# Altium footprint library LUMI_Standard_Auto_Soldering_LIB.PcbLib: 344 footprints (part 13 of 22)
Each footprint in its own frame and in the unit in brackets; x right, y up, seen from the top. Pads: shape width x height; smd on the part's side, far side on the other; paste and mask are expansions set on the pad; w line width, h text height; cw(c..) or ccw(c..) is an arc to the next point about the centre after c.
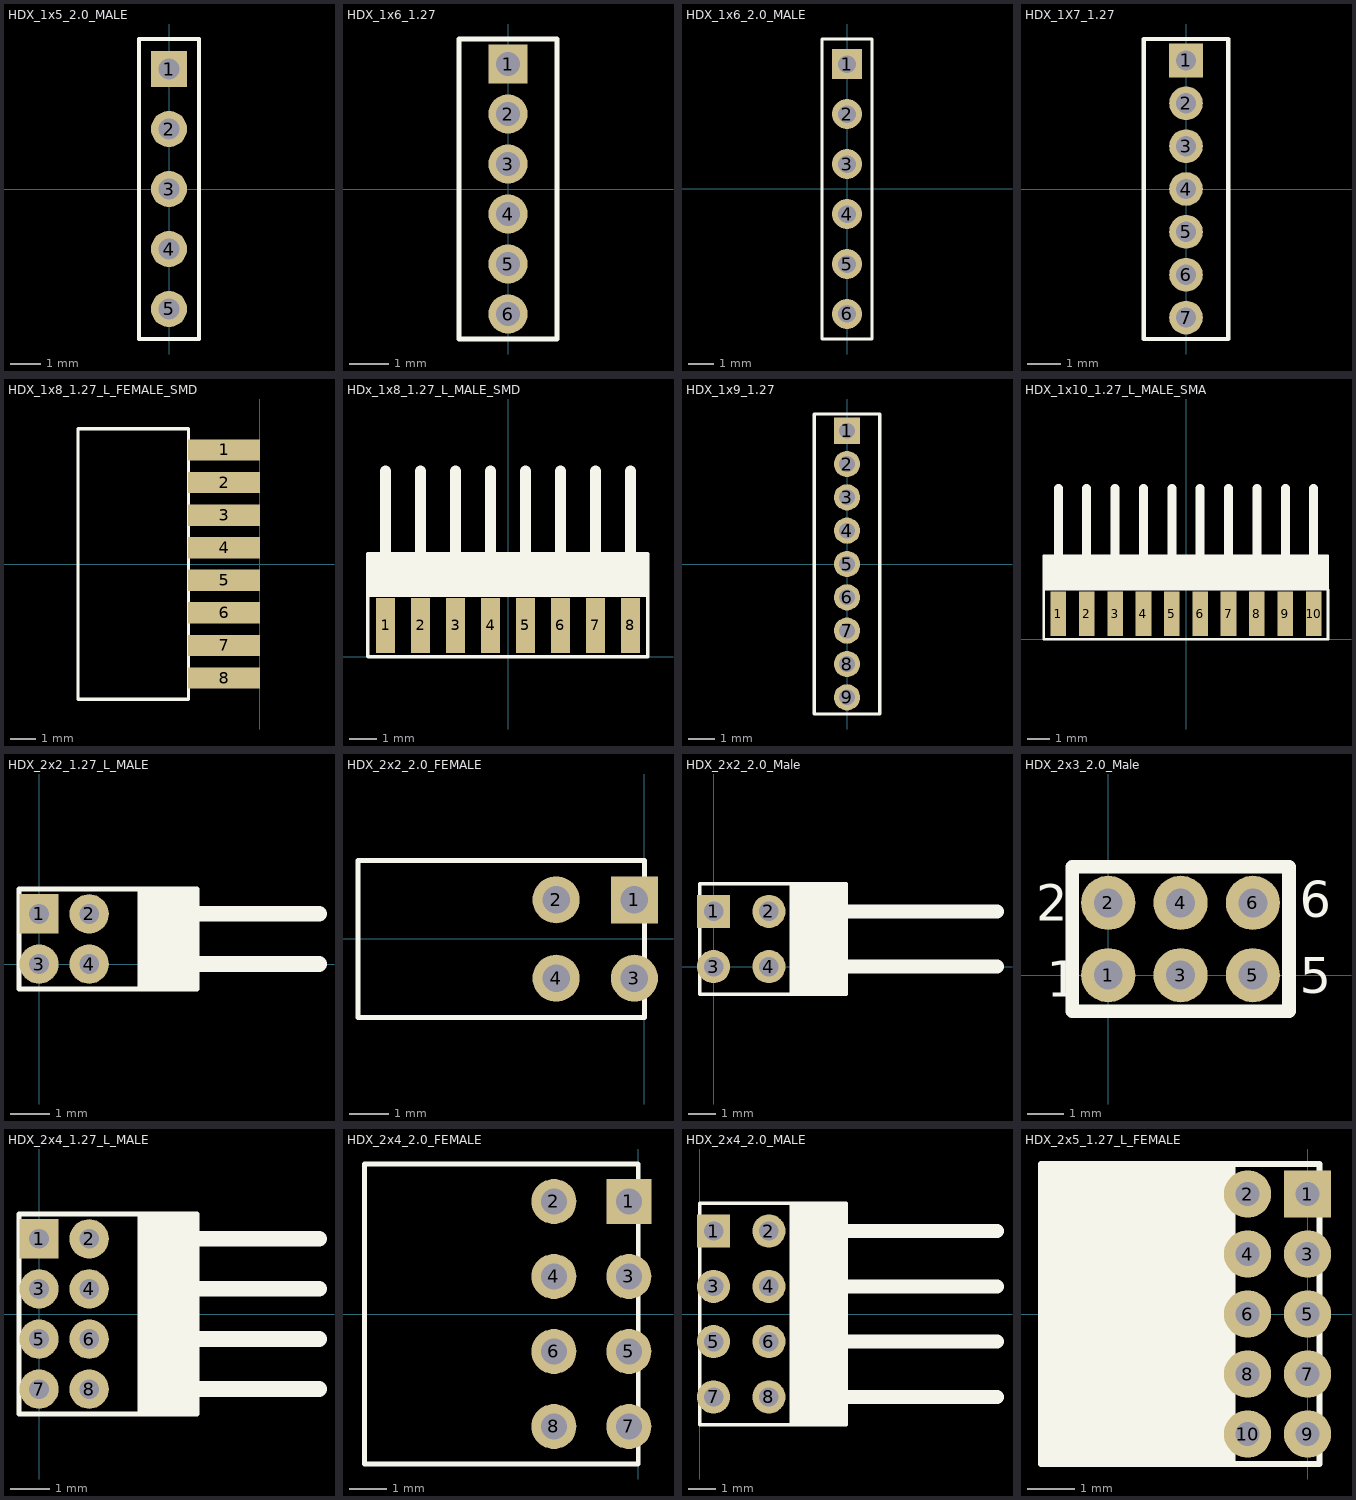
[diagram p12: the footprints below, top view; thin cyan lines are the x and y axes]

## HDX_1x5_2.0_MALE [mm]
pads (5):
  rect 1.2x1.2 hole 0.7 mask+0.07: 1(0,4)
  round 1.2 hole 0.7 mask+0.07: 2(0,2) 3(0,0) 4(0,-2) 5(0,-4)
Top Overlay:
  lines w0.127: -1,-5 1,-5 1,-3 1,1 1,5 -1,5 -1,1 -1,-3 -1,-5
3D body: height 3, standoff -2, extent -0.249,3.75 0.25,4.248
3D body: height 3, standoff -2, extent -0.249,-4.25 0.25,-3.752
3D body: height 3, standoff -2, extent -0.249,-2.25 0.25,-1.752
3D body: height 3, standoff -2, extent -0.249,-0.25 0.25,0.248
3D body: height 3, standoff -2, extent -0.249,1.75 0.25,2.248
3D body: height 2, standoff 0, extent -1,-5 1,5

## HDX_1x6_1.27 [mm]
pads (6):
  rect 1x1 hole 0.6 mask+0.07: 1(0,3.175)
  round 1 hole 0.6 mask+0.07: 2(0,1.905) 3(0,0.635) 4(0,-0.635) 5(0,-1.905) 6(0,-3.175)
Top Overlay:
  lines w0.127: -1.25,-3.81 1.25,-3.81 1.25,-1.27 1.25,1.27 1.25,3.81 -1.25,3.81 -1.25,1.27 -1.25,-1.27 -1.25,-3.81

## HDX_1x6_2.0_MALE [mm]
pads (6):
  rect 1.2x1.2 hole 0.7 mask+0.07: 1(0,5)
  round 1.2 hole 0.7 mask+0.07: 2(0,3) 3(0,1) 4(0,-1) 5(0,-3) 6(0,-5)
Top Overlay:
  lines w0.127: -1,-6 1,-6 1,-2 1,2 1,6 -1,6 -1,2 -1,-2 -1,-6
3D body: height 3, standoff -2, extent -0.249,-5.25 0.25,-4.752
3D body: height 3, standoff -2, extent -0.249,4.75 0.25,5.248
3D body: height 3, standoff -2, extent -0.249,-3.25 0.25,-2.752
3D body: height 3, standoff -2, extent -0.249,-1.25 0.25,-0.752
3D body: height 3, standoff -2, extent -0.249,0.75 0.25,1.248
3D body: height 3, standoff -2, extent -0.249,2.75 0.25,3.248
3D body: height 2, standoff 0, extent -1,-6 1,6

## HDX_1X7_1.27 [mm]
pads (7):
  rect 1x1 hole 0.6 mask+0.07: 1(0,3.81)
  round 1 hole 0.6 mask+0.07: 2(0,2.54) 3(0,1.27) 4(0,0) 5(0,-1.27) 6(0,-2.54) 7(0,-3.81)
Top Overlay:
  lines w0.127: -1.25,-4.445 -1.25,-0.635 -1.25,1.905 -1.25,4.445 1.25,4.445 1.25,1.905 1.25,-0.635 1.25,-4.445 -1.25,-4.445

## HDX_1x8_1.27_L_FEMALE_SMD [mm]
pads (8):
  rect 2.8x0.83 smd mask+0.07: 1(-1.397,4.445) 2(-1.397,3.175) 3(-1.397,1.905) 4(-1.397,0.635) 5(-1.397,-0.635) 6(-1.397,-1.905) 7(-1.397,-3.175) 8(-1.397,-4.445)
Top Overlay:
  lines w0.127: -7.086,-2.73 -7.086,0.19 ; -7.086,-2.35 -7.086,-5.27 -2.786,-5.27 -2.786,-2.35 ; -7.086,-0.19 -7.086,2.73 ; -7.086,2.35 -7.086,5.27 -2.786,5.27 -2.786,2.35 ; -2.786,-2.73 -2.786,0.19 ; -2.786,-0.19 -2.786,2.73
3D body: height 1.8, standoff 0, extent -7.104,2.35 -2.786,5.27
3D body: height 1.8, standoff 0, extent -7.104,-0.19 -2.786,2.73
3D body: height 1.8, standoff 0, extent -7.104,-2.73 -2.786,0.19
3D body: height 1.8, standoff 0, extent -7.104,-5.27 -2.786,-2.35
3D body: height 0.4, standoff 0, extent -3.167,-4.699 -0.119,-4.191
3D body: height 0.4, standoff 0, extent -3.167,-3.429 -0.119,-2.921
3D body: height 0.4, standoff 0, extent -3.167,-2.159 -0.119,-1.651
3D body: height 0.4, standoff 0, extent -3.167,-0.889 -0.119,-0.381
3D body: height 0.4, standoff 0, extent -3.167,0.381 -0.119,0.889
3D body: height 0.4, standoff 0, extent -3.167,1.651 -0.119,2.159
3D body: height 0.4, standoff 0, extent -3.167,2.921 -0.119,3.429
3D body: height 0.4, standoff 0, extent -3.167,4.191 -0.119,4.699

## HDx_1x8_1.27_L_MALE_SMD [mm]
pads (8):
  rect 0.7x2 smd: 1(-4.445,1.143) 2(-3.175,1.143) 3(-1.905,1.143) 4(-0.635,1.143) 5(0.635,1.143) 6(1.905,1.143) 7(3.175,1.143) 8(4.445,1.143)
Top Overlay:
  rectangle: -5.095,2.243 5.08,3.743
  lines w0.127: 5.08,2.243 -5.095,2.243 ; -5.095,2.243 -5.095,0.443 -5.095,0.015 -5.08,0 5.08,0 5.08,3.743 -5.095,3.743 -5.095,2.243
  lines w0.4: -4.445,3.743 -4.445,6.743 ; -3.175,3.743 -3.175,6.743 ; -1.905,3.743 -1.905,6.743 ; -0.635,3.743 -0.635,6.743 ; 0.635,3.743 0.635,6.743 ; 1.905,3.743 1.905,6.743 ; 3.175,3.743 3.175,6.743 ; 4.445,3.743 4.445,6.743
3D body: height 1.45, standoff 1.05, extent 2.975,3.81 3.373,6.81
3D body: height 1.45, standoff 1.05, extent 1.705,3.81 2.103,6.81
3D body: height 1.45, standoff 1.05, extent 0.435,3.81 0.833,6.81
3D body: height 1.45, standoff 1.05, extent -0.835,3.81 -0.437,6.81
3D body: height 1.45, standoff 1.05, extent -2.105,3.81 -1.707,6.81
3D body: height 1.45, standoff 1.05, extent -3.375,3.81 -2.977,6.81
3D body: height 1.45, standoff 1.05, extent -4.645,3.81 -4.247,6.81
3D body: height 0.4, standoff 0, extent 2.921,0.381 3.429,2.159
3D body: height 0.4, standoff 0, extent 1.651,0.381 2.159,2.159
3D body: height 0.4, standoff 0, extent 0.381,0.381 0.889,2.159
3D body: height 0.4, standoff 0, extent -0.889,0.381 -0.381,2.159
3D body: height 0.4, standoff 0, extent -2.159,0.381 -1.651,2.159
3D body: height 0.4, standoff 0, extent -3.429,0.381 -2.921,2.159
3D body: height 0.4, standoff 0, extent -4.699,0.381 -4.191,2.159
3D body: height 2.5, standoff 0, extent -5.08,2.286 5.08,3.683
3D body: height 1.45, standoff 1.05, extent 4.245,3.81 4.643,6.81
3D body: height 0.4, standoff 0, extent 4.191,0.381 4.699,2.159

## HDX_1x9_1.27 [mm]
pads (9):
  rect 1x1 hole 0.6 mask+0.07: 1(0,5.08)
  round 1 hole 0.6 mask+0.07: 2(0,3.81) 3(0,2.54) 4(0,1.27) 5(0,0) 6(0,-1.27) 7(0,-2.54) 8(0,-3.81) 9(0,-5.08)
Top Overlay:
  lines w0.127: -1.25,-5.715 1.25,-5.715 1.25,0.635 1.25,3.175 1.25,5.715 -1.25,5.715 -1.25,3.175 -1.25,0.635 -1.25,-5.715

## HDX_1x10_1.27_L_MALE_SMA [mm]
pads (10):
  rect 0.7x2 smd: 1(-5.715,1.143) 2(-4.445,1.143) 3(-3.175,1.143) 4(-1.905,1.143) 5(-0.635,1.143) 6(0.635,1.143) 7(1.905,1.143) 8(3.175,1.143) 9(4.445,1.143) 10(5.715,1.143)
Top Overlay:
  rectangle: -6.365,2.243 6.335,3.743
  lines w0.127: -6.365,2.243 6.335,2.243 ; -6.365,2.243 -6.365,3.743 6.335,3.743 6.335,2.243 ; -6.365,2.243 -6.365,0.443 -6.365,0.015 -6.35,0 6.35,0 6.35,2.228 6.335,2.243
  lines w0.4: -5.715,3.743 -5.715,6.743 ; -4.445,3.743 -4.445,6.743 ; -3.175,3.743 -3.175,6.743 ; -1.905,3.743 -1.905,6.743 ; -0.635,3.743 -0.635,6.743 ; 0.635,3.743 0.635,6.743 ; 1.905,3.743 1.905,6.743 ; 3.175,3.743 3.175,6.743 ; 4.445,3.743 4.445,6.743 ; 5.715,3.743 5.715,6.743
3D body: height 2.5, standoff 0, extent -6.35,2.286 6.35,3.683
3D body: height 0.4, standoff 0, extent -5.969,0.381 -5.461,2.159
3D body: height 0.4, standoff 0, extent -4.699,0.381 -4.191,2.159
3D body: height 0.4, standoff 0, extent -3.429,0.381 -2.921,2.159
3D body: height 0.4, standoff 0, extent -2.159,0.381 -1.651,2.159
3D body: height 0.4, standoff 0, extent -0.889,0.381 -0.381,2.159
3D body: height 0.4, standoff 0, extent 0.381,0.381 0.889,2.159
3D body: height 0.4, standoff 0, extent 1.651,0.381 2.159,2.159
3D body: height 0.4, standoff 0, extent 2.921,0.381 3.429,2.159
3D body: height 0.4, standoff 0, extent 4.191,0.381 4.699,2.159
3D body: height 0.4, standoff 0, extent 5.461,0.381 5.969,2.159
3D body: height 1.45, standoff 1.05, extent -5.915,3.81 -5.517,6.81
3D body: height 1.45, standoff 1.05, extent -4.645,3.81 -4.247,6.81
3D body: height 1.45, standoff 1.05, extent -3.375,3.81 -2.977,6.81
3D body: height 1.45, standoff 1.05, extent -2.105,3.81 -1.707,6.81
3D body: height 1.45, standoff 1.05, extent -0.835,3.81 -0.437,6.81
3D body: height 1.45, standoff 1.05, extent 0.435,3.81 0.833,6.81
3D body: height 1.45, standoff 1.05, extent 1.705,3.81 2.103,6.81
3D body: height 1.45, standoff 1.05, extent 2.975,3.81 3.373,6.81
3D body: height 1.45, standoff 1.05, extent 4.245,3.81 4.643,6.81
3D body: height 1.45, standoff 1.05, extent 5.515,3.81 5.913,6.81

## HDX_2x2_1.27_L_MALE [mm]
pads (4):
  rect 1x1 hole 0.5 mask+0.07: 1(0,1.27)
  round 1 hole 0.5 mask+0.07: 2(1.27,1.27) 3(0,0) 4(1.27,0)
Top Overlay:
  rectangle: 2.5,-0.635 4,1.905
  lines w0.127: 3.992,-0.635 -0.508,-0.635 -0.508,1.905 3.992,1.905 ; 4,-0.635 4,1.905
  lines w0.4: 4,0.003 7.1,0.003 ; 4,1.273 7.1,1.273
3D body: height 2.27, standoff -2, extent -0.199,1.069 0.2,1.467
3D body: height 1, standoff -2, extent 1.052,1.069 1.451,1.467
3D body: height 2.47, standoff 2.07, extent 0,1.071 7.2,1.469
3D body: height 1.2, standoff 0.8, extent 1.27,1.072 7.17,1.47
3D body: height 3.4, standoff 0, extent 2.5,-0.635 4,1.905
3D body: height 1, standoff -2, extent 1.052,-0.2 1.451,0.198
3D body: height 2.27, standoff -2, extent -0.199,-0.2 0.2,0.198
3D body: height 1.2, standoff 0.8, extent 1.27,-0.198 7.17,0.2
3D body: height 2.47, standoff 2.07, extent 0,-0.199 7.2,0.199

## HDX_2x2_2.0_FEMALE [mm]
pads (4):
  rect 1.2x1.2 hole 0.7 mask+0.07: 1(-0.25,1)
  round 1.2 hole 0.7 mask+0.07: 2(-2.25,1) 3(-0.25,-1) 4(-2.25,-1)
Top Overlay:
  lines w0.127: -7.3,-2 -7.3,2 0,2 0,-2 -7.3,-2
3D body: height 4.9, standoff 0, extent -7.25,-2 0,2
3D body: height 3, standoff -2, extent -2.499,0.75 -2,1.248
3D body: height 2, standoff -2, extent -0.499,0.75 0,1.248
3D body: height 2, standoff -2, extent -0.499,-1.25 0,-0.752
3D body: height 3, standoff -2, extent -2.499,-1.25 -2,-0.752

## HDX_2x2_2.0_Male [mm]
pads (4):
  rect 1.2x1.2 hole 0.7 mask+0.07: 1(0,2)
  round 1.2 hole 0.7 mask+0.07: 2(2,2) 3(0,0) 4(2,0)
Top Overlay:
  rectangle: 2.8,-1 4.8,3
  lines w0.127: 2.8,-1 2.8,1 2.8,3 ; -0.5,-1 -0.5,3 4.8,3 4.8,-1 -0.5,-1
  lines w0.5: 3,0 10.25,0 ; 3,2 10.25,2
3D body: height 3.25, standoff 2.75, extent -0.499,-0.25 10.501,0.248
3D body: height 1.25, standoff 0.75, extent 1.501,-0.25 10.501,0.248
3D body: height 3, standoff -2, extent -0.249,-0.25 0.25,0.248
3D body: height 2, standoff -2, extent 1.751,-0.25 2.25,0.248
3D body: height 2, standoff -2, extent 1.751,1.75 2.25,2.248
3D body: height 3, standoff -2, extent -0.249,1.75 0.25,2.248
3D body: height 1.25, standoff 0.75, extent 1.501,1.75 10.501,2.248
3D body: height 3.25, standoff 2.75, extent -0.499,1.75 10.501,2.248
3D body: height 4, standoff 0, extent 2.75,-1 4.75,3

## HDX_2x3_2.0_Male [mm]
pads (6):
  round 1.5 hole 0.8: 1(0,0) 2(0,2) 3(2,0) 4(2,2) 5(4,0) 6(4,2)
Top Overlay:
  lines w0.381: -1,-1 -1,3 5,3 5,-1 -1,-1
  text "5" at 5.3,-0.5 h1
  text "6" at 5.3,1.6 h1
  text "2" at -2,1.5 h1
  text "1" at -1.7,-0.6 h1
3D body: height 2, standoff 0, extent -1,-1 5,3
3D body: height 5, standoff -3, extent 3.504,-0.499 4.5,0.499
3D body: height 5, standoff -3, extent 3.504,1.501 4.5,2.499
3D body: height 5, standoff -3, extent 1.504,1.501 2.5,2.499
3D body: height 5, standoff -3, extent 1.504,-0.499 2.5,0.499
3D body: height 5, standoff -3, extent -0.496,-0.499 0.5,0.499
3D body: height 5, standoff -3, extent -0.496,1.501 0.5,2.499

## HDX_2x4_1.27_L_MALE [mm]
pads (8):
  rect 1x1 hole 0.5 mask+0.07: 1(0,1.905)
  round 1 hole 0.5 mask+0.07: 2(1.27,1.905) 3(0,0.635) 4(1.27,0.635) 5(0,-0.635) 6(1.27,-0.635) 7(0,-1.905) 8(1.27,-1.905)
Top Overlay:
  rectangle: 2.5,-2.54 4,0
  rectangle: 2.5,0 4,2.54
  lines w0.127: 3.992,-2.54 -0.508,-2.54 -0.508,0 -0.508,2.54 3.992,2.54 ; 4,-2.54 4,0 4,2.54
  lines w0.4: 4,-1.902 7.1,-1.902 ; 4,-0.632 7.1,-0.632 ; 4,0.638 7.1,0.638 ; 4,1.908 7.1,1.908
3D body: height 2.27, standoff -2, extent -0.199,-0.836 0.2,-0.438
3D body: height 1, standoff -2, extent 1.052,-0.836 1.451,-0.438
3D body: height 2.47, standoff 2.07, extent 0,-0.834 7.2,-0.436
3D body: height 1.2, standoff 0.8, extent 1.27,-0.833 7.17,-0.435
3D body: height 3.4, standoff 0, extent 2.5,-2.54 4,0
3D body: height 1, standoff -2, extent 1.052,-2.105 1.451,-1.707
3D body: height 2.27, standoff -2, extent -0.199,-2.105 0.2,-1.707
3D body: height 1.2, standoff 0.8, extent 1.27,-2.103 7.17,-1.705
3D body: height 2.47, standoff 2.07, extent 0,-2.104 7.2,-1.706
3D body: height 2.47, standoff 2.07, extent 0,0.436 7.2,0.834
3D body: height 1.2, standoff 0.8, extent 1.27,0.437 7.17,0.835
3D body: height 2.27, standoff -2, extent -0.199,0.435 0.2,0.833
3D body: height 1, standoff -2, extent 1.052,0.435 1.451,0.833
3D body: height 3.4, standoff 0, extent 2.5,0 4,2.54
3D body: height 1.2, standoff 0.8, extent 1.27,1.707 7.17,2.105
3D body: height 2.47, standoff 2.07, extent 0,1.706 7.2,2.104
3D body: height 1, standoff -2, extent 1.052,1.704 1.451,2.102
3D body: height 2.27, standoff -2, extent -0.199,1.704 0.2,2.102

## HDX_2x4_2.0_FEMALE [mm]
pads (8):
  rect 1.2x1.2 hole 0.7 mask+0.07: 1(-0.25,3)
  round 1.2 hole 0.7 mask+0.07: 2(-2.25,3) 3(-0.25,1) 4(-2.25,1) 5(-0.25,-1) 6(-2.25,-1) 7(-0.25,-3) 8(-2.25,-3)
Top Overlay:
  lines w0.127: -7.3,-4 0,-4 0,0 0,4 -7.3,4 -7.3,0 -7.3,-4
3D body: height 3, standoff -2, extent -2.499,-3.25 -2,-2.752
3D body: height 2, standoff -2, extent -0.499,-3.25 0,-2.752
3D body: height 2, standoff -2, extent -0.499,-1.25 0,-0.752
3D body: height 3, standoff -2, extent -2.499,-1.25 -2,-0.752
3D body: height 4.9, standoff 0, extent -7.25,-4 0,0
3D body: height 4.9, standoff 0, extent -7.25,0 0,4
3D body: height 3, standoff -2, extent -2.499,2.75 -2,3.248
3D body: height 2, standoff -2, extent -0.499,2.75 0,3.248
3D body: height 2, standoff -2, extent -0.499,0.75 0,1.248
3D body: height 3, standoff -2, extent -2.499,0.75 -2,1.248

## HDX_2x4_2.0_MALE [mm]
pads (8):
  rect 1.2x1.2 hole 0.7 mask+0.07: 1(0.5,3)
  round 1.2 hole 0.7 mask+0.07: 2(2.5,3) 3(0.5,1) 4(2.5,1) 5(0.5,-1) 6(2.5,-1) 7(0.5,-3) 8(2.5,-3)
Top Overlay:
  rectangle: 3.3,-4 5.3,0
  rectangle: 3.3,0 5.3,4
  lines w0.127: 3.3,-4 3.3,-2 3.3,0 3.3,2 3.3,4 ; 0,-4 0,0 0,4 5.3,4 5.3,0 5.3,-4 0,-4
  lines w0.5: 3.5,-3 10.75,-3 ; 3.5,-1 10.75,-1 ; 3.5,1 10.75,1 ; 3.5,3 10.75,3
3D body: height 3.25, standoff 2.75, extent 0.001,-3.25 11.001,-2.752
3D body: height 1.25, standoff 0.75, extent 2.001,-3.25 11.001,-2.752
3D body: height 3, standoff -2, extent 0.251,-3.25 0.75,-2.752
3D body: height 2, standoff -2, extent 2.251,-3.25 2.75,-2.752
3D body: height 2, standoff -2, extent 2.251,-1.25 2.75,-0.752
3D body: height 3, standoff -2, extent 0.251,-1.25 0.75,-0.752
3D body: height 1.25, standoff 0.75, extent 2.001,-1.25 11.001,-0.752
3D body: height 3.25, standoff 2.75, extent 0.001,-1.25 11.001,-0.752
3D body: height 4, standoff 0, extent 3.25,-4 5.25,0
3D body: height 4, standoff 0, extent 3.25,0 5.25,4
3D body: height 3.25, standoff 2.75, extent 0.001,2.75 11.001,3.248
3D body: height 1.25, standoff 0.75, extent 2.001,2.75 11.001,3.248
3D body: height 3, standoff -2, extent 0.251,2.75 0.75,3.248
3D body: height 2, standoff -2, extent 2.251,2.75 2.75,3.248
3D body: height 2, standoff -2, extent 2.251,0.75 2.75,1.248
3D body: height 3, standoff -2, extent 0.251,0.75 0.75,1.248
3D body: height 1.25, standoff 0.75, extent 2.001,0.75 11.001,1.248
3D body: height 3.25, standoff 2.75, extent 0.001,0.75 11.001,1.248

## HDX_2x5_1.27_L_FEMALE [mm]
pads (10):
  rect 1x1 hole 0.5 mask+0.07: 1(0,2.54)
  round 1 hole 0.5 mask+0.07: 2(-1.27,2.54) 3(0,1.27) 4(-1.27,1.27) 5(0,0) 6(-1.27,0) 7(0,-1.27) 8(-1.27,-1.27) 9(0,-2.54) 10(-1.27,-2.54)
Top Overlay:
  region: -1.524,3.175 -5.646,3.175 -5.646,-3.175 -1.524,-3.175
  lines w0.127: -5.646,-3.175 0.254,-3.175 0.254,0.635 0.254,3.175 -5.646,3.175 -5.646,0.635 -5.646,-3.175
3D body: height 2.47, standoff 2.07, extent -5.75,2.339 0,2.737
3D body: height 1, standoff -2, extent -1.451,2.341 -1.052,2.739
3D body: height 2.27, standoff -2, extent -0.2,2.341 0.199,2.739
3D body: height 1.2, standoff 0.8, extent -5.72,2.34 -1.27,2.738
3D body: height 3.4, standoff 0, extent -5.646,-3.175 -1.524,3.175
3D body: height 1.2, standoff 0.8, extent -5.72,1.07 -1.27,1.468
3D body: height 2.27, standoff -2, extent -0.2,1.071 0.199,1.469
3D body: height 1, standoff -2, extent -1.451,1.071 -1.052,1.469
3D body: height 2.47, standoff 2.07, extent -5.75,1.069 0,1.467
3D body: height 1.2, standoff 0.8, extent -5.72,-0.2 -1.27,0.198
3D body: height 2.27, standoff -2, extent -0.2,-0.199 0.199,0.199
3D body: height 1, standoff -2, extent -1.451,-0.199 -1.052,0.199
3D body: height 2.47, standoff 2.07, extent -5.75,-0.201 0,0.197
3D body: height 1.2, standoff 0.8, extent -5.72,-1.47 -1.27,-1.072
3D body: height 2.27, standoff -2, extent -0.2,-1.469 0.199,-1.071
3D body: height 1, standoff -2, extent -1.451,-1.469 -1.052,-1.071
3D body: height 2.47, standoff 2.07, extent -5.75,-1.471 0,-1.073
3D body: height 1.2, standoff 0.8, extent -5.72,-2.74 -1.27,-2.342
3D body: height 2.27, standoff -2, extent -0.2,-2.739 0.199,-2.341
3D body: height 1, standoff -2, extent -1.451,-2.739 -1.052,-2.341
3D body: height 2.47, standoff 2.07, extent -5.75,-2.741 0,-2.343